# Altium footprint library JL_PCB.PCBLIB: 1129 footprints (part 72 of 72)
Each footprint in its own frame and in the unit in brackets; x right, y up, seen from the top. Pads: shape width x height; smd on the part's side, far side on the other; paste and mask are expansions set on the pad; w line width, h text height; cw(c..) or ccw(c..) is an arc to the next point about the centre after c.
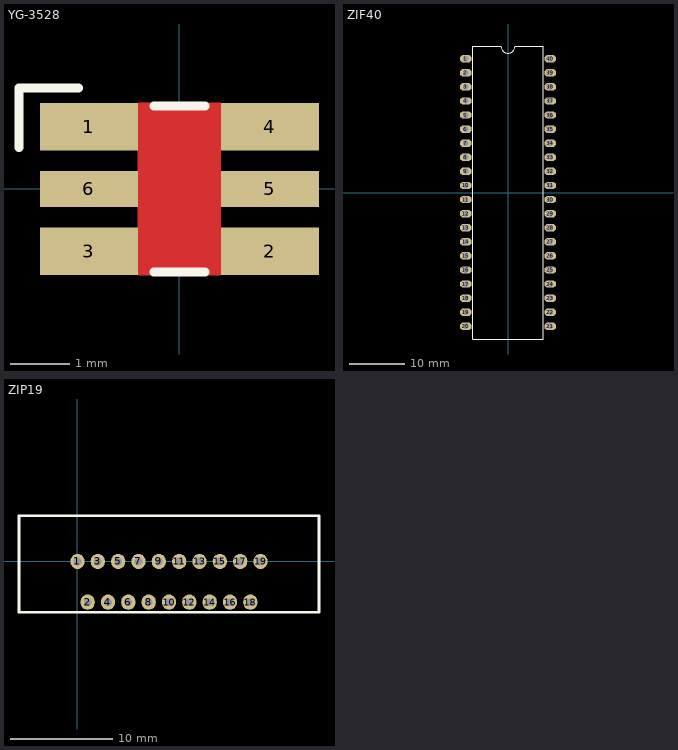
[diagram p71: the footprints below, top view; thin cyan lines are the x and y axes]

## YG-3528 [mm]
pads (6):
  rect 1.65x0.8 smd mask+0.05: 1(-1.524,1.05) 2(1.524,-1.05) 3(-1.524,-1.05) 4(1.525,1.05)
  rect 1.65x0.6 smd mask+0.05: 5(1.524,0) 6(-1.525,0)
TopLayer:
  pour cut-out: 0.7,-1.45 0.7,1.45 -0.7,1.45 -0.7,-1.45
TopOverlay:
  lines w0.15: -2.7,0.7 -2.7,1.7 -1.7,1.7 ; -0.431,-1.4 0.431,-1.4 ; -0.431,1.4 0.431,1.4

## ZIF40 [mil]
pads (40):
  oct 80x52 hole 39.37: 1(-300,950) 2(-300,850) 3(-300,750) 4(-300,650) 5(-300,550) 6(-300,450) 7(-300,350) 8(-300,250) 9(-300,150) 10(-300,50) 11(-300,-50) 12(-300,-150) 13(-300,-250) 14(-300,-350) 15(-300,-450) 16(-300,-550) 17(-300,-650) 18(-300,-750) 19(-300,-850) 20(-300,-950) 21(300,-950) 22(300,-850) 23(300,-750) 24(300,-650) 25(300,-550) 26(300,-450) 27(300,-350) 28(300,-250) 29(300,-150) 30(300,-50) 31(300,50) 32(300,150) 33(300,250) 34(300,350) 35(300,450) 36(300,550) 37(300,650) 38(300,750) 39(300,850) 40(300,950)
TopOverlay:
  lines w6: -250,-1040 -250,1040 -50,1040 ccw(c0,1040) 50,1040 250,1040 250,-1040 -250,-1040
3D body "ZIF-40.STEP": height 146.85, standoff -483.07, extent -487.3,-1195 452.3,1844.03

## ZIP19 [mm]
pads (19):
  oval 1.4x1.5 hole 0.75: 1(0,0) 2(1,-4) 3(2,0) 4(3,-4) 5(4,0) 6(5,-4) 7(6,0) 8(7,-4) 9(8,0) 10(9,-4) 11(10,0) 12(11,-4) 13(12,0) 14(13,-4) 15(14,0) 16(15,-4) 17(16,0) 18(17,-4) 19(18,0)
TopOverlay:
  lines w0.254: -5.75,-5 23.75,-5 23.75,4.5 -5.75,4.5 -5.75,-5